# Altium integrated library STM32F407_Board.IntLib: 166 symbols (part 1 of 2) (continued)
## 282834-2 (continued)
TERM BLK 2P SIDE ENT 2.54MM PCB; Manufacturer: TE Connectivity AMP Connectors; Current: 10A; Mating Orientation: Horizontal with Board; Number of Levels: 1; Pitch: 0.100" (2.54mm); Positions Per Level: 2; Voltage: 150V; Wire Gauge: 16-30 AWG; Wire Termination: Screw - Rising Cage Clamp; Part Number: 282834-2; Color: Green; ComponentLink1Description: Datasheet; ComponentLink1URL: https://www.te.com/commerce/DocumentDelivery/DDEController?Action=srchrtrv&DocNm=282834&DocType=Customer+Drawing&DocLang=English; ComponentLink2Description: DigiKey Link; ComponentLink2URL: http://digikey.com/product-detail/en/te-connectivity-amp-connectors/282834-2/A98333-ND/1150135; LastUpdated: 15/01/2020 04:15:38; Lifecycle Status: Active; Minimum Order: 1; Mounting Type: Through Hole; Packaging: Bulk; Part Status: Active; Price: 0.88; Series: Buchanan; Supplier 1: DigiKey; Supplier Part Number 1: A98333-ND
footprint TE 282834-2
pins: 1, 2

## 282834-3
designator J?
TERM BLK 3P SIDE ENT 2.54MM PCB; Manufacturer: TE Connectivity AMP Connectors; Current: 10A; Mating Orientation: Horizontal with Board; Number of Levels: 1; Pitch: 0.100" (2.54mm); Positions Per Level: 3; Voltage: 150V; Wire Gauge: 16-30 AWG; Wire Termination: Screw - Rising Cage Clamp; Part Number: 282834-3; Color: Green; ComponentLink1Description: Datasheet; ComponentLink1URL: https://www.te.com/commerce/DocumentDelivery/DDEController?Action=srchrtrv&DocNm=282834&DocType=Customer+Drawing&DocLang=English; ComponentLink2Description: DigiKey Link; ComponentLink2URL: http://digikey.com/product-detail/en/te-connectivity-amp-connectors/282834-3/A98334-ND/1153264; LastUpdated: 1/15/2020 04:15:50; Lifecycle Status: Active; Minimum Order: 1; Mounting Type: Through Hole; Packaging: Bulk; Part Status: Active; Price: 2.01; Series: Buchanan; Supplier 1: DigiKey; Supplier Part Number 1: A98334-ND
footprint TE 282834-3
pins: 1, 2, 3

## 282834-4
designator J?
TERM BLK 4P SIDE ENT 2.54MM PCB; Manufacturer: TE Connectivity AMP Connectors; Current: 10A; Mating Orientation: Horizontal with Board; Number of Levels: 1; Pitch: 0.100" (2.54mm); Positions Per Level: 4; Voltage: 150V; Wire Gauge: 16-30 AWG; Wire Termination: Screw - Rising Cage Clamp; Part Number: 282834-4; Color: Green; ComponentLink1Description: Datasheet; ComponentLink1URL: https://www.te.com/commerce/DocumentDelivery/DDEController?Action=srchrtrv&DocNm=282834&DocType=Customer+Drawing&DocLang=English; ComponentLink2Description: DigiKey Link; ComponentLink2URL: http://digikey.com/product-detail/en/te-connectivity-amp-connectors/282834-4/A98335-ND/1153265; LastUpdated: 1/15/2020 04:16:05; Lifecycle Status: Active; Minimum Order: 1; Mounting Type: Through Hole; Packaging: Bulk; Part Status: Active; Price: 2.68; Series: Buchanan; Supplier 1: DigiKey; Supplier Part Number 1: A98335-ND
footprint TE 282834-4
pins: 1, 2, 3, 4

## ! Inductor Template
designator L??  (value not drawn)
Inductor, ??uH; Value: ??H
footprint L0402-Murata-WW-High-Density (Chip Inductor, 2-Leads, Body 1.00x0.50mm, IPC High Density)
pins: 1, 2

## ABLS-25.000MHZ-20-D2YF-T
designator Y?, comment 25MHz
CRYSTAL 25.000MHZ 20PF SMD; Part Number: ABLS-25.000MHZ-20-D2YF-T; Manufacturer: Abracon LLC; ESR (Equivalent Series Resistance): 40 Ohms; Frequency Stability: ±30ppm; Frequency Tolerance: ±20ppm; Operating Mode: Fundamental; ComponentLink1Description: Datasheet; ComponentLink1URL: https://abracon.com/Resonators/abls.pdf; ComponentLink2Description: DigiKey Link; ComponentLink2URL: http://digikey.com/product-detail/en/abracon-llc/ABLS-25.000MHZ-20-D2YF-T/535-14354-1-ND/8582115; Frequency: 25MHz; Height - Seated (Max): 0.165" (4.20mm); LastUpdated: 02/09/2020 01:21:46; Lifecycle Status: Active; Load Capacitance: 20pF; Minimum Order: 1; Mounting Type: Surface Mount; Operating Temperature: -40°C ~ 85°C; Package / Case: HC-49/US; Packaging: TapeAndReel; PartId: 14; Part Status: Active; Price: 0.24; Series: ABLS; Size / Dimension: 0.449" L x 0.185" W (11.40mm x 4.70mm); Supplier 1: DigiKey; Supplier Part Number 1: 535-14354-1-ND; Type: MHz Crystal; Value: 25MHz
footprint ABRACON ABLS
pins: 1, 2

## ADXL345
designator U??  Manufacturer Part Number 1: ADXL345
SENSOR, ACCELEROMETER, 3-AXIS, I2C, SMT, +/-16g, LGA-14 3mmX5mm; Manufacturer 1: Analog Devices; Part Name: B39162B4353P810; Body Size: 1.4mm x 1.1mm; Current: None; Item Phase: In Production; MFG Package: QCS5P; Use in new designs: Yes; Part Number: ADXL345; Height: 0.45mm; Max Operating Temp: 85; Min Operating Temp: -40; Pins: 5; Revision: 0A; Voltage: N/A; UBX Code: None
footprint ADXL345 (CC-14-1, 14-pin LGA, Analog Devices Accelerometer, .8mm pitch, 3mmX5mm)
pins: 1 VDDIO (power) "Digital Supply Logic Voltage", 2 GND (power) "Ground", 3 RSVD "Connect to Vs or No Connect", 4 GND (power) "Ground", 5 GND (power) "Ground", 6 VS (power) "Supply Voltage", 7 ~{CS} (in) "Logic Low Chip Select for SPI Modes", 8 INT1 (out) "Interrupt 1 Output", 9 INT2 (out) "Interrupt 2 Output", 10 NC "Not Internally Connected", 11 RSVD "Connect to Gnd or No Connect", 12 SDO/ALT ADDR (io) "Serial Data Output/Alternate I2C Address Select.", 13 SDA/SDI/SDIO (io) "Serial Data (I2C)/Serial Data Input (SPI 4-Wire)/Serial Data Input and Output (SPI 3-Wire).", 14 SCL/SCLK (io) "Serial Communications Clock."

## APTR3216SECK/J3-PRV
designator D?, comment Red
LED SMD; Part Number: APTR3216SECK/J3-PRV; Manufacturer: Kingbright; Configuration: 1206; Current - Test: 20mA; Lens Color: Colorless; Lens Size: 1.60mm x 1.40mm; Lens Style: Rectangle with Flat Top; Lens Transparency: Clear; Millicandela Rating: 350mcd; Viewing Angle: 140°; Voltage - Forward (Vf) (Typ): 2.2V; Wavelength - Dominant: 625nm; Wavelength - Peak: 640nm; Color: Red; ComponentLink1Description: Datasheet; ComponentLink1URL: http://www.kingbrightusa.com/images/catalog/SPEC/APTR3216SECK-J3-PRV.pdf; ComponentLink2Description: DigiKey Link; ComponentLink2URL: http://digikey.com/product-detail/en/kingbright/APTR3216SECK-J3-PRV/754-APTR3216SECK-J3-PRVCT-ND/10293112; Device Package: 1206 (3216 Metric); Height (Max): 1.25mm; LastUpdated: 9/2/2020 01:21:09; Lifecycle Status: Active; Minimum Order: 1; Mounting Type: Surface Mount; Package / Case: 1206 (3216 Metric); Packaging: TapeAndReel; PartId: 194; Part Status: Active; Price: 0.20; Series: Heli-R; Size / Dimension: 3.20mm L x 1.60mm W; Supplier 1: DigiKey; Supplier Part Number 1: 754-APTR3216SECK/J3-PRVCT-ND; Supplier Device Package: 1206; Value: Red
footprint LED 1206_3216 RED
pins: 1, 2

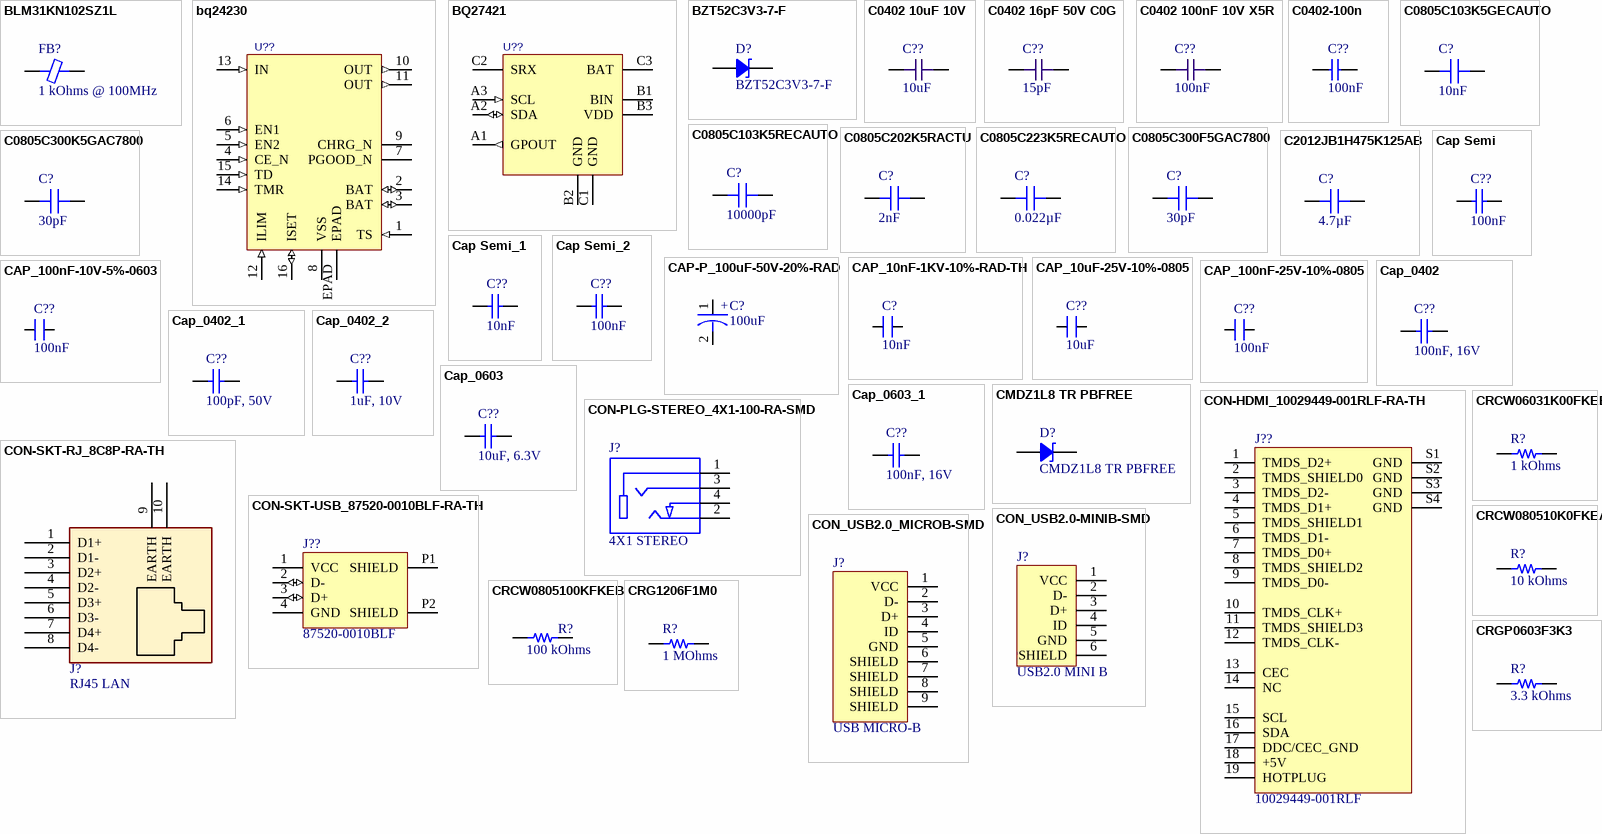
[diagram p1: symbols BLM31KN102SZ1L to CRGP0603F3K3]

## BLM31KN102SZ1L
designator FB?, comment 1 kOhms @ 100MHz
FERRITE BEAD 1 KOHM 1206 1LN; Part Number: BLM31KN102SZ1L; Manufacturer: Murata Electronics; Current Rating (Max): 2A; DC Resistance (DCR) (Max): 75mOhm; Filter Type: Power Line; Number of Lines: 1; ComponentLink1Description: Datasheet; ComponentLink1URL: https://www.murata.com/en-global/products/productdata/8796751200286/QNFA9115.pdf; ComponentLink2Description: DigiKey Link; ComponentLink2URL: http://digikey.com/product-detail/en/murata-electronics/BLM31KN102SZ1L/490-16522-1-ND/7564150; Device Package: 1206 (3216 Metric); Height (Max): 0.071" (1.80mm); Impedance @ Frequency: 1 kOhms @ 100MHz; LastUpdated: 02/09/2020 01:18:24; Lifecycle Status: Active; Minimum Order: 1; Mounting Type: Surface Mount; Operating Temperature: -55°C ~ 125°C; Package / Case: 1206 (3216 Metric); Packaging: TapeAndReel; PartId: 1565; Part Status: Active; Price: 0.10; Ratings: AEC-Q200; Series: BLM; Size / Dimension: 0.126" L x 0.063" W (3.20mm x 1.60mm); Supplier 1: DigiKey; Supplier Part Number 1: 490-16522-1-ND; Value: 1 kOhms @ 100MHz
footprint FER 1206_3216
pins: 1, 2

## bq24230
designator U??  (value not drawn)
BAT CHARGER, Li-ION, SMT, USB, PWR PATH, 500mA, 4.4V, 3mmx3mm QFN-16; Manufacturer 1: Texas Instruments; Body Size: 3.3mm x 3.3mm; Item Phase: Unreleased; MFG Package: VQFN-16; SMT Pitch: 0.5mm; Use in new designs: Yes; Voltage: 5-6.5V; UBX Code: None; Part Number: bq24230; Manufacturer Part Number 1: bq24230; Supplier 1: Digi-key; Supplier Part Number 1: 296-23937-2-ND; Height: 1mm; Max Operating Temp: 85; Min Operating Temp: -40; Pins: 16; Revision: None; Size: Other; Manufacturer 2: None; Manufacturer Part Number 2: None; Supplier 2: None; Supplier Part Number 2: None
footprint QFN0.5P3x3-16Pin_W-Pad (Quad Flat No-Lead, 0.5mm Pitch, 16 Contact, Exposed Pad, 3mmX3mm)
pins: 1 TS (in) "ExternalNTCThermistorInput.Connectthe TS inputto the NTCthermistorin the batterypack.TS monitorsa 10-kΩNTCthermistor.For applicationsthat do not utilizethe TS function,connecta 10-kΩfixedresistorfromTS toVSSto maintaina validvoltagelevelon TS.", 2 BAT (io) "ChargerPowerStageOutputand BatteryVoltageSenseInput.ConnectBATto the positiveterminalof thebattery.BypassBATto VSSwith a 4.7-μF to 47-μF ceramiccapacitor.", 3 BAT (io) "ChargerPowerStageOutputand BatteryVoltageSenseInput.ConnectBATto the positiveterminalof thebattery.BypassBATto VSSwith a 4.7-μF to 47-μF ceramiccapacitor.", 4 CE_N (in) "ChargeEnableActive-LowInput.ConnectCE to a high logiclevelto disablebatterycharging.OUTis activeandbatterysupplementmodeis still available.ConnectCE to a low logiclevelto enablethe batterycharger.CE isinternallypulleddownwith ~285kΩ. Do not leaveCE unconnectedto ensureproperoperation.", 5 EN2 (in) "InputCurrentLimitConfigurationInputs.Use EN1and EN2controlthe maximuminputcurrentand enableUSBcompliance.See Table1 for the descriptionof the operationstates.EN1and EN2are internallypulleddownwith~285kΩ. Do not leaveEN1or EN2unconnectedto ensureproperoperation.", 6 EN1 (in) "InputCurrentLimitConfigurationInputs.Use EN1and EN2controlthe maximuminputcurrentand enableUSBcompliance.See Table1 for the descriptionof the operationstates.EN1and EN2are internallypulleddownwith~285kΩ. Do not leaveEN1or EN2unconnectedto ensureproperoperation.", 7 PGOOD_N (oc) "Open-drainPowerGoodStatusIndicationOutput.PGOODpullsto VSSwhena validinputsourceis detected.PGOODis high-impedancewhenthe inputpoweris not withinspecifiedlimits.ConnectPGOODto the desiredlogicvoltagerail usinga 1-kΩ– 100-kΩresistor,or use with an LEDfor visualindication.", 8 VSS (power) "Ground.Connectto the thermalpad and to the groundrail of the circuit.", 9 CHRG_N (oc) "Open-DrainChargingStatusIndicationOutput.CHGpullsto VSSwhenthe batteryis charging.CHGis highimpedancewhenchargingis completeand whenchargeris disabled.", 10 OUT (out) "SystemSupplyOutput.OUTprovidesa regulatedoutputwhenthe inputis belowthe OVPthresholdand abovethe regulationvoltage.Whenthe inputis out of the operationrange,OUTis connectedto VBAT. ConnectOUTtothe systemload.BypassOUTto VSSwith a 4.7-μF to 47-μF ceramiccapacitor.", 11 OUT (out) "SystemSupplyOutput.OUTprovidesa regulatedoutputwhenthe inputis belowthe OVPthresholdand abovethe regulationvoltage.Whenthe inputis out of the operationrange,OUTis connectedto VBAT. ConnectOUTtothe systemload.BypassOUTto VSSwith a 4.7-μF to 47-μF ceramiccapacitor.", 12 ILIM (in) "AdjustableCurrentLimitProgrammingInput.Connecta 3.1-kΩto 7.8-kΩresistorfromILIMto VSSto programthemaximuminputcurrent(EN2=1,EN1=0).The inputcurrentincludesthe systemload and the batterychargecurrent.LeavingILIMunconnecteddisablesall charging.In USB100/500mode(EN2= 0, EN1=0/1),ILIMcan beleft floating.", 13 IN (in) "InputPowerConnection.ConnectIN to the connectedto externalDC supply(AC adapteror USBport).The inputoperatingrangeis 4.35V to 6.6 V. The inputcan acceptvoltagesup to 26 V withoutdamagebut operationissuspended.Connectbypasscapacitor1μF to 10μF to VSS", 14 TMR (in) "TimerProgrammingInput.TMRcontrolsthe prechargeand fast-chargesafetytimers.ConnectTMRto VSStodisableall safetytimers.Connecta 18-kΩto 72-kΩresistorbetweenTMRand VSSto programthe timersadesiredlength.LeaveTMRunconnectedto set the timersto the 5-hourfast chargeand 30-minuteprechargedefaulttimervalues.", 15 TD (in) "TerminationDsableInput.ConnectTD high to disablechargertermination.ConnectTD to VSSto enablechargertermination.TD is checkedduringstart-uponly and cannotbe changedduringoperation.See the TD sectioninthis datasheetfor a descriptionof the behaviorwhenterminationis disabled.TD is internallypulleddownto VSSwith ~285kΩ. Do not leaveTD unconnectedto ensureproperoperation.", 16 ISET (io) "Fast-ChargeCurrentProgrammingInput.Connecta 1.8-kΩto 36-kΩresistorfromISETto VSSto programthefast-chargecurrentlevel.Chargingis disabledif ISETis left unconnected.Whilecharging,the voltageat ISETreflectsthe actualchargingcurrentand can be usedto monitorchargecurrent.See theChargeCurrentTranslatorsectionfor moredetails.", EPAD (power) "SystemSupplyOutput.OUTprovidesa regulatedoutputwhenthe inputis belowthe OVPthresholdand abovethe regulationvoltage.Whenthe inputis out of the operationrange,OUTis connectedto VBAT. ConnectOUTtothe systemload.BypassOUTto VSSwith a 4.7-μF to 47-μF ceramiccapacitor."

## BQ27421
designator U??
IC, SMT, BATTERY GAUGE, INGLE CELL Li-ION, COULOMB COUNTER, DSBGA-9 1.6mmX1.6mm; Part Number: BQ27421; Manufacturer 1: Texas Instruments; Part Name: B39162B4353P810; Body Size: 1.4mm x 1.1mm; Current: None; Item Phase: In Production; MFG Package: QCS5P; Use in new designs: Yes; Manufacturer Part Number 1: BQ27421; Height: 0.45mm; Max Operating Temp: 85; Min Operating Temp: -40; Pins: 5; Revision: 0A; Voltage: N/A; UBX Code: None
footprint BQ27421 (9-DSBGA, 9 pin Texas Instruments BQ27421 Battery Gauge, .5mm pitch, 1.6mmX1.6mm)
pins: A1 GPOUT (out) "General Purpose Open Collector Output", A2 SDA (io) "I2C Data Signal", A3 SCL (in) "I2C Clock Signal", B1 BIN (power) "Battery Insertion Detection Input", B2 GND (power) "Ground", B3 VDD (power) "1.8V LDO Output, Decouple with 1uF, Do Not Connect To External Circuit", C1 GND (power) "Ground", C2 SRX "Current Sense Input Connected to VSYS", C3 BAT (power) "LDO Input and Connection To Battery, Decouple with 1uF"

## BZT52C3V3-7-F
designator D?
DIODE ZENER 3.3V 500MW SOD123; Manufacturer: Diodes Incorporated; Current - Reverse Leakage @ Vr: 5µA @ 1V; Impedance (Max) (Zzt): 95 Ohms; Tolerance: ±6%; Voltage - Forward (Vf) (Max) @ If: 900mV @ 10mA; Part Number: BZT52C3V3-7-F; ComponentLink1Description: Datasheet; ComponentLink1URL: https://www.diodes.com/assets/Datasheets/ds18004.pdf; ComponentLink2Description: DigiKey Link; ComponentLink2URL: http://digikey.com/product-detail/en/diodes-incorporated/BZT52C3V3-7-F/BZT52C3V3-FDICT-ND/717854; LastUpdated: 9/2/2020 01:19:25; Lifecycle Status: Active; Minimum Order: 1; Mounting Type: Surface Mount; Operating Temperature: -65°C ~ 150°C; Package / Case: SOD-123; Packaging: TapeAndReel; PartId: 2214; Part Status: Active; Power - Max: 500mW; Price: 0.04; Series: -; Supplier 1: DigiKey; Supplier Part Number 1: BZT52C3V3-FDICT-ND; Supplier Device Package: SOD-123; Voltage - Zener (Nom) (Vz): 3.3V
footprint SOD-123
pins: 1, 2

## C0402 10uF 10V
designator C??  value 10uF  (hidden comment: C0402 10uF 10V)
Chip Capacitor, 0402, 10uF, 10V, X5R; EIA Code: X5R; Max. Voltage: 10V; Supplier 1: Digi-Key; Supplier Part Number 1: 1276-1450-2-ND
footprint C0402-HIGH-DENSITY (Chip Capacitor, 2-Leads, Body 1.02x0.51mm, IPC High Density)
pins: 1, 2

## C0402 16pF 50V C0G
designator C??, comment value 15pF  (hidden comment: C0402 15pF 50V C0G)
Chip Capacitor, 0402, 15pF, 50V, C0G; Max. Voltage: 50V; Supplier 1: Digi-Key; Supplier Part Number 1: 490-5926-1-ND; EIA Code: C0G
footprint C0402-IPC
footprint C0402-HIGH-DENSITY (Chip Capacitor, 2-Leads, Body 1.02x0.51mm, IPC High Density)
pins: 1, 2

## C0402 100nF 10V X5R
designator C??  value 100nF  (hidden comment: C0402 100nF 10V X5R)
Chip Capacitor, 0402, 100nF, 10V, X5R; EIA Code: X5R; Max. Voltage: 10V; Supplier 1: Digi-Key; Supplier Part Number 1: 311-1336-1-ND
footprint C0402-IPC
footprint C0402-HIGH-DENSITY (Chip Capacitor, 2-Leads, Body 1.02x0.51mm, IPC High Density)
pins: 1, 2

## C0402-100n
designator C??, comment 100nF
0.10µF 50V Ceramic Capacitor X7R 0603; Manufacturer Part Number: CL10B104KB8SFNC; Value: 100nF; Digi-Key Part Number: 1276-1936-1-ND
footprint c0402
footprint c0603
pins: 1, 2

## C0805C103K5GECAUTO
designator C?, comment 10nF
CAP CER 0805 10NF 50V C0G 10%; Part Number: C0805C103K5GECAUTO; Manufacturer: KEMET; Capacitance: 10000pF; Temperature Coefficient: C0G, NP0; Value: 10nF; Applications: Automotive, ESD Protection; ComponentLink1Description: Datasheet; ComponentLink1URL: https://api.kemet.com/component-edge/download/datasheet/C0805C103K5GECAUTO.pdf; ComponentLink2Description: DigiKey Link; ComponentLink2URL: http://digikey.com/product-detail/en/kemet/C0805C103K5GECAUTO/399-17903-1-ND/8640570; Device Package: 0805 (2012 Metric); Features: Low ESL; LastUpdated: 02/09/2020 01:04:06; Lifecycle Status: Active; Minimum Order: 1; Mounting Type: Surface Mount, MLCC; Operating Temperature: -55°C ~ 125°C; Package / Case: 0805 (2012 Metric); Packaging: TapeAndReel; PartId: 18336; Part Status: Active; Price: 0.06; Ratings: AEC-Q200; Series: ESD SMD Auto C0G; Size / Dimension: 0.079" L x 0.049" W (2.00mm x 1.25mm); Supplier 1: DigiKey; Supplier Part Number 1: 399-17903-1-ND; Thickness (Max): 0.039" (1.00mm); Tolerance: ±10%; Voltage - Rated: 50V
footprint CAP 0805_2012
pins: 1, 2

## C0805C103K5RECAUTO
designator C?, comment 10000pF
CAP CER 0805 10NF 50V X7R 10%; Part Number: C0805C103K5RECAUTO; Manufacturer: KEMET; Value: 10000pF; Applications: Automotive, ESD Protection; Capacitance: 10000pF; ComponentLink1Description: Datasheet; ComponentLink1URL: https://api.kemet.com/component-edge/download/datasheet/C0805C103K5RECAUTO.pdf; ComponentLink2Description: DigiKey Link; ComponentLink2URL: http://digikey.com/product-detail/en/kemet/C0805C103K5RECAUTO/399-17885-1-ND/8640552; Device Package: 0805 (2012 Metric); LastUpdated: 02/09/2020 01:04:31; Lifecycle Status: Active; Minimum Order: 1; Mounting Type: Surface Mount, MLCC; Operating Temperature: -55°C ~ 125°C; Package / Case: 0805 (2012 Metric); Packaging: TapeAndReel; PartId: 8498; Part Status: Active; Price: 0.05; Ratings: AEC-Q200; Series: ESD SMD Auto X7R; Size / Dimension: 0.079" L x 0.049" W (2.00mm x 1.25mm); Supplier 1: DigiKey; Supplier Part Number 1: 399-17885-1-ND; Temperature Coefficient: X7R; Thickness (Max): 0.035" (0.88mm); Tolerance: ±10%; Voltage - Rated: 50V
footprint CAP 0805_2012
pins: 1, 2

## C0805C202K5RACTU
designator C?, comment 2nF
CAP CER 2000PF 50V X7R 0805; Part Number: C0805C202K5RACTU; Manufacturer: KEMET; Tolerance: ±10%; Value: 2nF; Applications: Bypass, Decoupling; Capacitance: 2000pF; ComponentLink1Description: Datasheet; ComponentLink1URL: https://content.kemet.com/datasheets/KEM_C1002_X7R_SMD.pdf; ComponentLink2Description: DigiKey Link; ComponentLink2URL: http://digikey.com/product-detail/en/kemet/C0805C202K5RACTU/399-7343-1-ND/3316964; Device Package: 0805 (2012 Metric); LastUpdated: 02/09/2020 01:04:17; Lifecycle Status: Active; Minimum Order: 1; Mounting Type: Surface Mount, MLCC; Operating Temperature: -55°C ~ 125°C; Package / Case: 0805 (2012 Metric); Packaging: TapeAndReel; PartId: 14983; Part Status: Active; Price: 0.03; Series: SMD Comm X7R; Size / Dimension: 0.079" L x 0.049" W (2.00mm x 1.25mm); Supplier 1: DigiKey; Supplier Part Number 1: 399-7343-1-ND; Temperature Coefficient: X7R; Thickness (Max): 0.035" (0.88mm); Voltage - Rated: 50V
footprint CAP 0805_2012
pins: 1, 2

## C0805C223K5RECAUTO
designator C?, comment 0.022µF
CAP CER 0805 22NF 50V X7R 10%; Part Number: C0805C223K5RECAUTO; Manufacturer: KEMET; Value: 0.022µF; Applications: Automotive, ESD Protection; Capacitance: 0.022µF; ComponentLink1Description: Datasheet; ComponentLink1URL: https://api.kemet.com/component-edge/download/datasheet/C0805C223K5RECAUTO.pdf; ComponentLink2Description: DigiKey Link; ComponentLink2URL: http://digikey.com/product-detail/en/kemet/C0805C223K5RECAUTO/399-17886-1-ND/8640553; Device Package: 0805 (2012 Metric); LastUpdated: 9/2/2020 01:04:15; Lifecycle Status: Active; Minimum Order: 1; Mounting Type: Surface Mount, MLCC; Operating Temperature: -55°C ~ 125°C; Package / Case: 0805 (2012 Metric); Packaging: TapeAndReel; PartId: 15719; Part Status: Active; Price: 0.05; Ratings: AEC-Q200; Series: ESD SMD Auto X7R; Size / Dimension: 0.079" L x 0.049" W (2.00mm x 1.25mm); Supplier 1: DigiKey; Supplier Part Number 1: 399-17886-1-ND; Temperature Coefficient: X7R; Thickness (Max): 0.035" (0.88mm); Tolerance: ±10%; Voltage - Rated: 50V
footprint CAP 0805_2012
pins: 1, 2

## C0805C300F5GAC7800
designator C?, comment 30pF
CAP CER 30PF 50V NP0 0805; Part Number: C0805C300F5GAC7800; Manufacturer: KEMET; Temperature Coefficient: C0G, NP0; Tolerance: ±1%; Value: 30pF; Applications: General Purpose; Capacitance: 30pF; ComponentLink1Description: Datasheet; ComponentLink1URL: https://api.kemet.com/component-edge/download/datasheet/C0805C300F5GACTU.pdf; ComponentLink2Description: DigiKey Link; ComponentLink2URL: http://digikey.com/product-detail/en/kemet/C0805C300F5GAC7800/399-14586-1-ND/7103878; Device Package: 0805 (2012 Metric); Features: Low ESL; LastUpdated: 02/09/2020 01:04:34; Lifecycle Status: Active; Minimum Order: 1; Mounting Type: Surface Mount, MLCC; Operating Temperature: -55°C ~ 125°C; Package / Case: 0805 (2012 Metric); Packaging: TapeAndReel; PartId: 7037; Part Status: Active; Price: 0.29; Series: SMD Comm C0G; Size / Dimension: 0.079" L x 0.049" W (2.00mm x 1.25mm); Supplier 1: DigiKey; Supplier Part Number 1: 399-14586-1-ND; Thickness (Max): 0.035" (0.88mm); Voltage - Rated: 50V
footprint CAP 0805_2012
pins: 1, 2

## C0805C300K5GAC7800
designator C?, comment 30pF
CAP CER 30PF 50V NP0 0805; Part Number: C0805C300K5GAC7800; Manufacturer: KEMET; Temperature Coefficient: C0G, NP0; Tolerance: ±10%; Value: 30pF; Applications: General Purpose; Capacitance: 30pF; ComponentLink1Description: Datasheet; ComponentLink1URL: https://api.kemet.com/component-edge/download/datasheet/C0805C300K5GACTU.pdf; ComponentLink2Description: DigiKey Link; ComponentLink2URL: http://digikey.com/product-detail/en/kemet/C0805C300K5GAC7800/399-17443-1-ND/8570410; Device Package: 0805 (2012 Metric); Features: Low ESL; LastUpdated: 02/09/2020 01:04:24; Lifecycle Status: Active; Minimum Order: 1; Mounting Type: Surface Mount, MLCC; Operating Temperature: -55°C ~ 125°C; Package / Case: 0805 (2012 Metric); Packaging: TapeAndReel; PartId: 12424; Part Status: Active; Price: 0.06; Series: SMD Comm C0G; Size / Dimension: 0.079" L x 0.049" W (2.00mm x 1.25mm); Supplier 1: DigiKey; Supplier Part Number 1: 399-17443-1-ND; Thickness (Max): 0.035" (0.88mm); Voltage - Rated: 50V
footprint CAP 0805_2012
pins: 1, 2

## C2012JB1H475K125AB
designator C?, comment 4.7µF
CAP CER 4.7UF 50V JB 0805; Part Number: C2012JB1H475K125AB; Manufacturer: TDK Corporation; Tolerance: ±10%; Value: 4.7µF; Applications: General Purpose; Capacitance: 4.7µF; ComponentLink1Description: Datasheet; ComponentLink1URL: https://product.tdk.com/info/en/catalog/datasheets/mlcc_commercial_general_en.pdf?ref_disty=digikey; ComponentLink2Description: DigiKey Link; ComponentLink2URL: http://digikey.com/product-detail/en/tdk-corporation/C2012JB1H475K125AB/445-11510-1-ND/3953176; Device Package: 0805 (2012 Metric); Features: Low ESL; LastUpdated: 02/09/2020 01:04:16; Lifecycle Status: Active; Minimum Order: 1; Mounting Type: Surface Mount, MLCC; Operating Temperature: -25°C ~ 85°C; Package / Case: 0805 (2012 Metric); Packaging: TapeAndReel; PartId: 15333; Part Status: Active; Price: 0.18; Series: C; Size / Dimension: 0.079" L x 0.049" W (2.00mm x 1.25mm); Supplier 1: DigiKey; Supplier Part Number 1: 445-11510-1-ND; Temperature Coefficient: JB; Thickness (Max): 0.057" (1.45mm); Voltage - Rated: 50V
footprint CAP 0805_2012
pins: 1, 2

## Cap Semi
designator C??, comment 100nF
0.10µF 50V Ceramic Capacitor X7R 0603; Manufacturer Part Number: CL10B104KB8SFNC; Value: 100nF; Digi-Key Part Number: 1276-1936-1-ND
footprint C1206 (Chip Capacitor, Body 3.2x1.6mm, IPC High Density)
footprint 0402 (Chip Capacitor, Body 1.0x0.5mm, IPC High Density)
footprint C2512 (Chip Capacitor, Body 2.54x1.27mm, IPC High Density)
footprint 0402 (Chip Capacitor, Body 1.0x0.5mm, IPC High Density)
footprint C1210 (Chip Capacitor, Body 3.2x2.5mm, IPC High Density)
simulation model CAP (Semiconductor Capacitor)
signal-integrity model Cap Semi
footprint 1608[0603] (Chip Capacitor, Body 1.6x0.8mm, IPC High Density)
footprint C0402
footprint c0603
pins: 1, 2

## Cap Semi_1
designator C??, comment 10nF
10000pF 50V Ceramic Capacitor X7R 0603; Manufacturer Part Number: CL10B103KB8NCNC; Published: 8-Jun-2000; LatestRevisionDate: 29-May-2009; LatestRevisionNote: IPC-7351 Footprint Added.; PackageReference: C1206; Publisher: Altium Limited; PackageDescription: Chip Capacitor; Value: 10nF; Digi-Key Part Number: 1276-1921-1-ND
footprint C0603
footprint 0402 (Chip Capacitor, Body 1.0x0.5mm, IPC High Density)
footprint C2512 (Chip Capacitor, Body 2.54x1.27mm, IPC High Density)
footprint 0402 (Chip Capacitor, Body 1.0x0.5mm, IPC High Density)
footprint C1210 (Chip Capacitor, Body 3.2x2.5mm, IPC High Density)
simulation model CAP (Semiconductor Capacitor)
signal-integrity model Cap Semi
footprint C0805
footprint C0402
pins: 1, 2

## Cap Semi_2
designator C??, comment 100nF
0.10µF 50V Ceramic Capacitor X7R 0603; Manufacturer Part Number: CL10B104KB8SFNC; Value: 100nF; Digi-Key Part Number: 1276-1936-1-ND
footprint C0603
footprint 0402 (Chip Capacitor, Body 1.0x0.5mm, IPC High Density)
footprint C2512 (Chip Capacitor, Body 2.54x1.27mm, IPC High Density)
footprint 0402 (Chip Capacitor, Body 1.0x0.5mm, IPC High Density)
footprint C1210 (Chip Capacitor, Body 3.2x2.5mm, IPC High Density)
simulation model CAP (Semiconductor Capacitor)
signal-integrity model Cap Semi
footprint C0805
footprint C0402
pins: 1, 2

## CAP-P_100uF-50V-20%-RAD
designator C?, comment 100uF
Cap, Aec-Q200, 100Uf, 50V, Alu Elec, Smd Rohs Compliant: Yes; Manufacturer: KEMET; Manufacturer Part Number: A768MS107M1HLAV024; Pricing 1: 2500=1.10647 (USD); Supplier 1: Digi-Key; Supplier Part Number 1: C317C622F5G5TA7301-ND
footprint ACAP_P305_D393_H393_RAD (Aluminium Capacitor)
pins: 1, 2
text: +

## CAP_10nF-1KV-10%-RAD-TH
designator C?, comment 10nF
Cap Ceramic 0.001uF 1000V X7R 10% Radial 5mm 125°C Bulk; Manufacturer: Murata; Manufacturer Part Number: RDER73A102K2K1H03B; Capacitance: 1nF; Voltage Rating: 1kV; Lead/Base Style: Formed Leads; Lead Diameter: 0.5mm; Supplier 1: Digi-Key; RoHS: Yes; Category: Ceramic Capacitors; Stock 1: 6888; Pricing 1: 1=0.75000, 10=0.53200, 50=0.40220, 100=0.35030, 500=0.25946, 1000=0.22055, 2500=0.20758, 5000=0.19460 (USD); Mount: Through Hole; Case/Package: Radial; Min Operating Temperature: -55°C; Max Operating Temperature: 125°C; Package Quantity: 500; Packaging: Bulk; Tolerance: 10%; Dielectric: X7R; Termination: Radial; Resistor Type: Ceramic; Voltage Rating (DC): 1kV; Length: 5.5mm; Width: 0.124inch; Height: 4mm; Height - Seated (Max): 0.157inch; Lead Pitch: 0.197inch; Lead Free: Lead Free; RoHS Compliant: Yes; ComponentLink1URL: https://datasheet.ciiva.com/29539/product-29539129.pdf?src-supplier=Digi-Key; ComponentLink1Description: https://datasheet.ciiva.com/29539/product-29539129.pdf?src-supplier=Digi-Key; Supplier Part Number 1: 490-8942-ND
footprint CAP_P196_102X287_H332_RAD_TH
pins: 1, 2

## CAP_10uF-25V-10%-0805
designator C??, comment 10uF
10µF ±10% 25V Ceramic Capacitor X5R 0805 (2012 Metric); Manufacturer: Murata Electronics; Manufacturer Part Number: GRM21BR61E106KA73K; Case/Package: 0805; Supplier-1: Digikey
footprint CAP_0805 (Ceramic Capacitor)
pins: 1, 2

## CAP_100nF-10V-5%-0603
designator C??, comment 100nF
0.1µF ±10% 10V Ceramic Capacitor X7R 0603 (1608 Metric); Manufacturer: Yageo; Manufacturer Part Number: CC0603KRX7R6BB104; Case/Package: 0603; Supplier-1: Digikey
footprint CAP_0603 (Capacitor)
pins: 1, 2
